# Altium footprint library 2016AbbasBasereh9365731239.PcbLib: 204 footprints (part 8 of 13)
Each footprint in its own frame and in the unit in brackets; x right, y up, seen from the top. Pads: shape width x height; smd on the part's side, far side on the other; paste and mask are expansions set on the pad; w line width, h text height; cw(c..) or ccw(c..) is an arc to the next point about the centre after c.
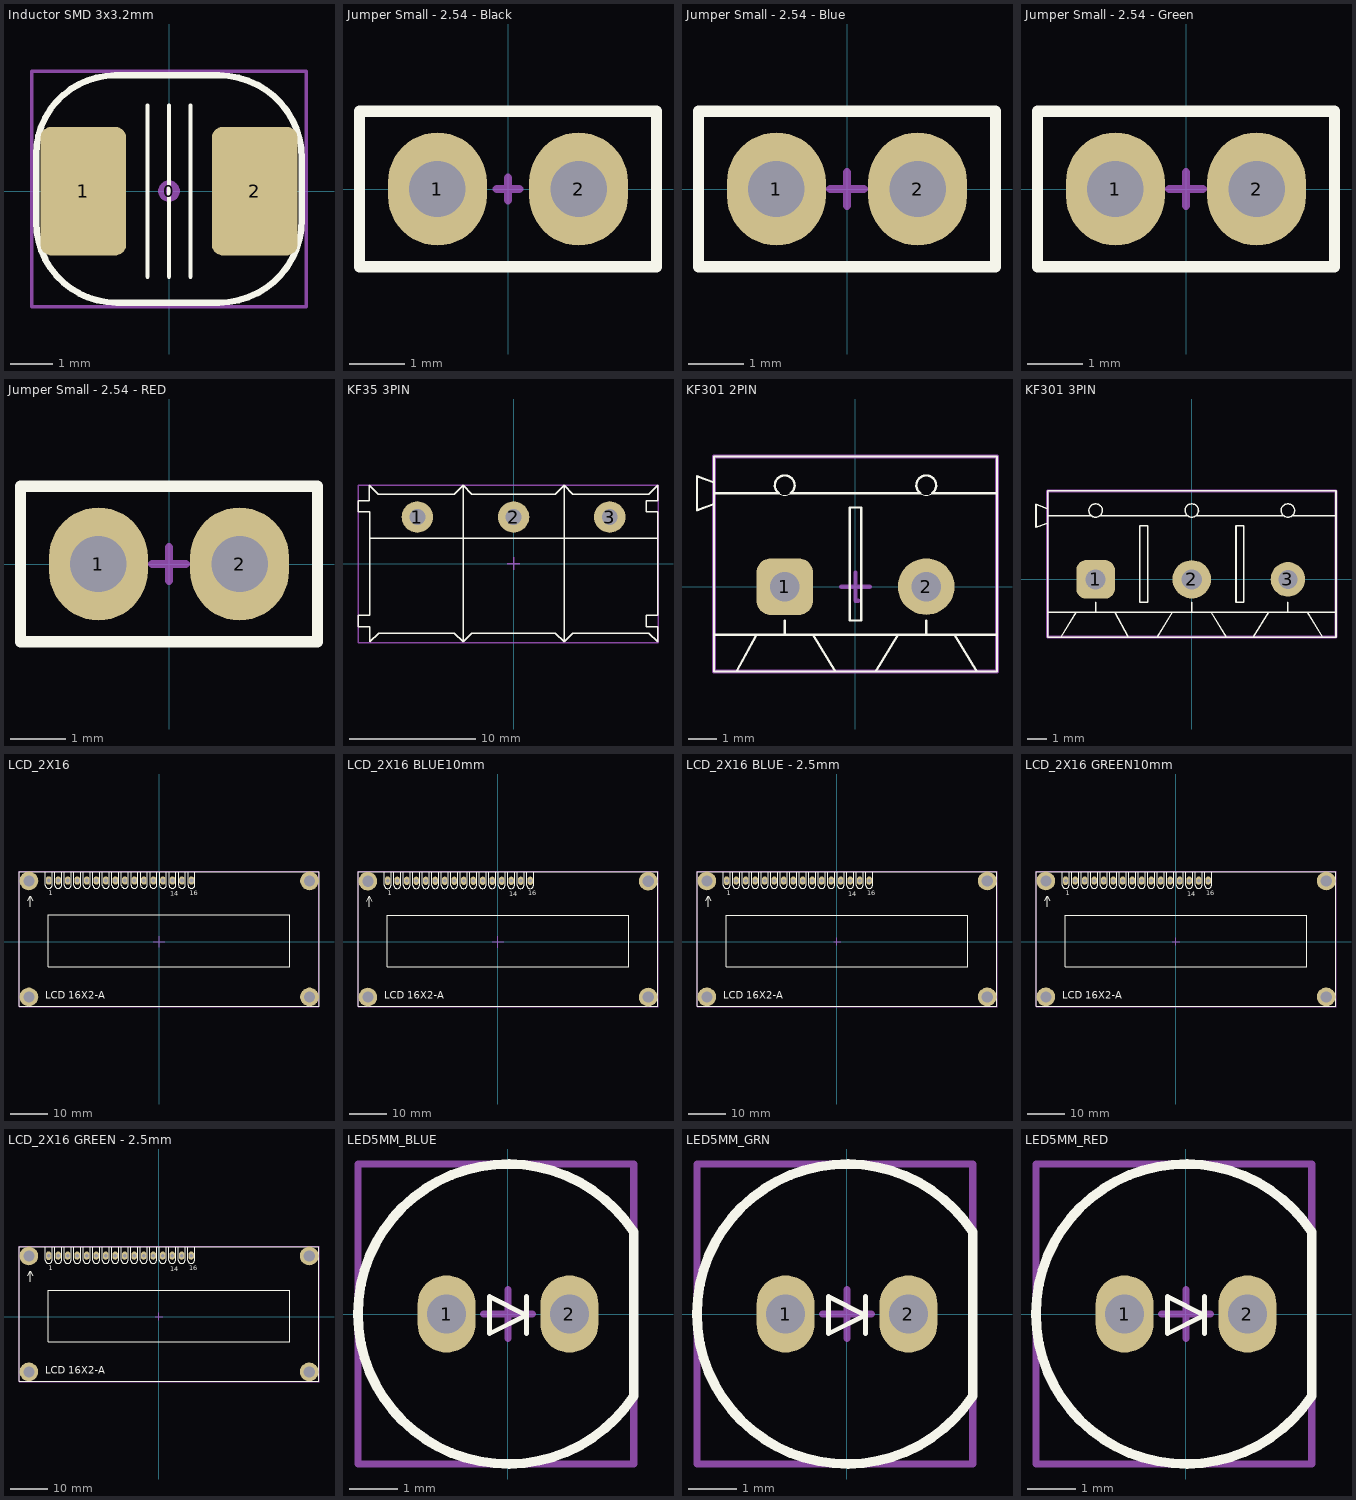
[diagram p7: the footprints below, top view; thin cyan lines are the x and y axes]

## Inductor SMD 3x3.2mm [mm] "Inductor 4.7µH SMD 3x3.2mm"
pads (3):
  round 0.508 on Mech15: 0(0,0)
  rrect25% 2x3 smd: 1(-2,0) 2(2,0)
Top Overlay:
  lines w0.1: -0.5,-2 -0.5,2 ; 0,-2 0,2 ; 0.5,-2 0.5,2
  lines w0.15: -3.1,-0.725 ccw(c-1.225,-0.725) -1.225,-2.6 1.165,-2.6 ccw(c1.165,-0.665) 3.1,-0.665 3.1,0.765 ccw(c1.165,0.765) 1.165,2.7 -1.252,2.7 ccw(c-1.252,0.852) -3.1,0.852 -3.1,-0.725
Mechanical 15:
  lines w0.076: -3.2,-2.7 3.2,-2.7 3.2,2.8 -3.2,2.8 -3.2,-2.7
3D body "smd self 4.7uH.stp": height 4.5, standoff 0, extent -2.899,-2.6 2.889,2.6

## Jumper Small - 2.54 - Black [mil] "Designer Abbas Basereh"
height 300
pads (2):
  oval 70x80 hole 40: 1(-50,0) 2(50,0)
Top Overlay:
  lines w7.87: -105.12,-55.12 105.12,-55.12 105.12,55.12 -105.12,55.12 -105.12,-55.12
Mechanical 15:
  lines w5.91: -7.87,0 7.87,0 ; 0,-7.87 0,7.87 ; -106.3,-55.12 106.3,-55.12 106.3,55.12 -106.3,55.12 -106.3,-55.12
3D body "jumper_akspt_g-red.STEP": height 337.4, standoff 102.36, extent -98.03,-48.03 98.04,48.04
3D body "header02.STEP": height 330, standoff -100, extent -100,-50 100,50

## Jumper Small - 2.54 - Blue [mil] "Designer Abbas Basereh"
height 300
pads (2):
  oval 70x80 hole 40: 1(-50,0) 2(50,0)
Top Overlay:
  lines w7.87: -105.12,-55.12 105.12,-55.12 105.12,55.12 -105.12,55.12 -105.12,-55.12
Mechanical 15:
  lines w5.91: -11.81,0 11.81,0 ; 0,-11.81 0,11.81 ; -106.3,-55.12 -106.3,55.12 106.3,55.12 106.3,-55.12 -106.3,-55.12
3D body "jumper_akspt_g-red.STEP": height 337.4, standoff 102.36, extent -98.03,-48.03 98.04,48.04
3D body "header02.STEP": height 330, standoff -100, extent -100,-50 100,50

## Jumper Small - 2.54 - Green [mil] "Designer Abbas Basereh"
height 300
pads (2):
  oval 70x80 hole 40: 1(-50,0) 2(50,0)
Top Overlay:
  lines w7.87: -105.12,-55.12 -105.12,55.12 105.12,55.12 105.12,-55.12 -105.12,-55.12
Mechanical 15:
  lines w5.91: -11.81,0 11.81,0 ; 0,-11.81 0,11.81 ; -106.3,-55.12 106.3,-55.12 106.3,55.12 -106.3,55.12 -106.3,-55.12
3D body "header02.STEP": height 330, standoff -100, extent -100,-50 100,50
3D body "jumper_akspt_g-red.STEP": height 337.4, standoff 102.36, extent -98.03,-48.03 98.04,48.04

## Jumper Small - 2.54 - RED [mil] "Designer Abbas Basereh"
height 300
pads (2):
  oval 70x80 hole 40: 1(-50,0) 2(50,0)
Top Overlay:
  lines w7.87: -105.12,-55.12 -105.12,55.12 105.12,55.12 105.12,-55.12 -105.12,-55.12
Mechanical 15:
  lines w5.91: -11.81,0 11.81,0 ; 0,-11.81 0,11.81 ; -106.3,-55.12 -106.3,55.12 106.3,55.12 106.3,-55.12 -106.3,-55.12
3D body "header02.STEP": height 330, standoff -100, extent -100,-50 100,50
3D body "jumper_akspt_g-red.STEP": height 337.4, standoff 102.36, extent -98.03,-48.03 98.04,48.04

## KF35 3PIN [mm] "Designer Abbas Basereh"
height 12.5
pads (3):
  round 2.5 hole 1.25: 1(-7.62,3.7) 2(0,3.7) 3(7.62,3.7)
Top Overlay:
  lines w0.1: -11.4,2 11.4,2 ; -4,-6.2 -4,6.2 ; -4,-6.2 -3.3,-5.5 3.3,-5.5 4,-6.2 ; -4,-6.2 -4.7,-5.5 -10.7,-5.5 -11.4,-6.2 -11.4,-5 -12.3,-5 -12.3,-4.1 -11.4,-4.1 -11.4,4.1 -11.43,4.1 -12.33,4.1 -12.33,5 -11.43,5 -11.43,6.2 -10.73,5.5 -4.7,5.5 -4,6.2 ; -4,6.2 -3.3,5.5 3.3,5.5 4,6.2 ; 4,-6.2 4,6.2 ; 4,-6.2 4.7,-5.5 10.73,-5.5 11.43,-6.2 11.43,-5 10.53,-5 10.53,-4.1 11.43,-4.1 11.43,4.1 10.53,4.1 10.53,5 11.43,5 11.43,6.2 10.73,5.5 4.7,5.5 4,6.2
Mechanical 15:
  lines w0.1: -0.5,0 0.5,0 ; 0,-0.5 0,0.5 ; -12.3,-6.275 -12.3,6.225 11.45,6.225 11.45,-6.275 -12.3,-6.275

## KF301 2PIN [mm] "Designer Abbas Basereh"
height 7.5
pads (2):
  rrect50% 2x2 hole 1.05: 1(-2.5,0)
  round 2 hole 1.05: 2(2.5,0)
Top Overlay:
  lines w0.013: -2.71,3.3 ccw(c-2.5,3.58) -2.29,3.3 ; 2.29,3.3 ccw(c2.5,3.58) 2.71,3.3
  lines w0.08: -4.2,-3 -3.5,-1.7 -1.5,-1.7 -0.7,-3 ; -2.5,-1.7 -2.5,-1.2 ; 0.7,-3 1.5,-1.7 3.5,-1.7 4.3,-3 ; 2.5,-1.7 2.5,-1.2 ; -5.6,2.7 -5,2.918 ; -5.6,2.7 -5.6,3.9 ; -5.6,2.7 -5,2.918 ; -5.6,2.7 -5.6,3.9 ; -5.6,3.9 -5,3.682 ; -5.6,3.9 -5,3.682 ; -5,-3 -5,-1.7 ; -5,-3 5,-3 ; -5,-3 5,-3 ; -5,-3 -5,2.918 ; -5,-1.7 -5,3.3 ; -5,-1.7 5,-1.7 ; -5,3.3 -5,4.6 ; -5,3.3 -2.71,3.3 cw(c-2.5,3.58) -2.29,3.3 2.29,3.3 cw(c2.5,3.58) 2.71,3.3 5,3.3 ; -5,3.682 -5,4.6 ; -5,4.6 5,4.6 ; -5,4.6 5,4.6 ; 5,-3 5,-1.7 ; 5,-3 5,4.6 ; 5,-1.7 5,3.3 ; 5,3.3 5,4.6 ; -0.2,-1.2 -0.2,2.8 0.2,2.8 0.2,-1.2 -0.2,-1.2
Mechanical 15:
  lines w0.15: -0.5,0 0.5,0 ; 0,0.5 0,-0.5 0.1,-0.5 ; -5,-3 5,-3 5,4.6 -5,4.6 -5,-3
3D body "User Library-Terminal-Screw-3A-2way.STEP": height 10, standoff -3, extent -5.6,-3 5,4.6

## KF301 3PIN [mm] "Designer Abbas Basereh"
height 7.5
pads (3):
  rrect50% 2x2 hole 1.05: 1(-5,0)
  round 2 hole 1.05: 2(0,0)
  round 1.8 hole 1: 3(5,0)
Top Overlay:
  lines w0.08: -6.8,-3 -6,-1.7 -4,-1.7 -3.3,-3 ; -5,-1.7 -5,-1.2 ; -1.8,-3 -1,-1.7 1,-1.7 1.8,-3 ; 0,-1.7 0,-1.2 ; 3.2,-3 4,-1.7 6,-1.7 6.8,-3 ; 5,-1.7 5,-1.2 ; -8.1,2.7 -7.5,2.918 ; -8.1,2.7 -8.1,3.9 ; -8.1,2.7 -8.1,3.9 ; -8.1,2.7 -7.5,2.918 ; -8.1,3.9 -7.5,3.681 ; -8.1,3.9 -7.5,3.681 ; -7.5,-3 7.5,-3 ; -7.5,-3 -7.5,2.918 ; -7.5,-3 7.5,-3 ; -7.5,-3 -7.5,-1.7 ; -7.5,-1.7 7.5,-1.7 ; -7.5,-1.7 -7.5,3.3 ; -7.5,3.3 -5.21,3.3 ; -7.5,3.3 -7.5,4.6 ; -7.5,3.681 -7.5,4.6 ; -7.5,4.6 7.5,4.6 ; -7.5,4.6 7.5,4.6 ; -5.21,3.3 cw(c-5,3.58) -4.79,3.3 ; -5.21,3.3 ccw(c-5,3.58) -4.79,3.3 ; -4.79,3.3 -0.21,3.3 ; -0.21,3.3 cw(c0,3.58) 0.21,3.3 ; -0.21,3.3 ccw(c0,3.58) 0.21,3.3 ; 0.21,3.3 4.79,3.3 ; 4.79,3.3 cw(c5,3.58) 5.21,3.3 ; 4.79,3.3 ccw(c5,3.58) 5.21,3.3 ; 5.21,3.3 7.5,3.3 ; 7.5,-3 7.5,4.6 ; 7.5,-3 7.5,-1.7 ; 7.5,-1.7 7.5,3.3 ; 7.5,3.3 7.5,4.6 ; -2.7,-1.2 -2.7,2.8 -2.3,2.8 -2.3,-1.2 -2.7,-1.2 ; 2.3,-1.2 2.7,-1.2 2.7,2.8 2.3,2.8 2.3,-1.2
Mechanical 15:
  lines w0.15: -7.5,-3 -7.5,4.6 7.5,4.6 7.5,-3 -7.5,-3
3D body "User Library-Terminal-Screw-3A-3way.STEP": height 10, standoff -3, extent -8.1,-3 7.5,4.6

## LCD_2X16 [mm] "LCD 2x16 Alphanumberic-Designer Abbas Basereh"
height 50
pads (20):
  oct 1.5x2.2 hole 1: 1(-29.464,16.3)
  oval 1.5x2.2 hole 1: 2(-26.924,16.3) 3(-24.384,16.3) 4(-21.844,16.3) 5(-19.304,16.3) 6(-16.764,16.3) 7(-14.224,16.3) 8(-11.684,16.3) 9(-9.144,16.3) 10(-6.604,16.3) 11(-4.064,16.3) 12(-1.524,16.3) 13(1.016,16.3) 14(3.556,16.3) 15(6.096,16.3) 16(8.636,16.3)
  round 5 hole 3: ""(-34.756,-14.775) ""(-34.756,16.213) ""(40.174,-14.775) ""(40.174,16.213)
Top Overlay:
  circle w0.2: c-34.796,-14.788 r1.25
  circle w0.2: c40.204,-14.788 r1.25
  circle w0.2: c-34.796,16.213 r1.25
  circle w0.2: c40.204,16.213 r1.25
  lines w0.2: -35.01,10.879 -34.375,12.149 -33.74,10.879 ; -34.375,9.337 -34.375,12.022 ; -30.353,18.669 -30.353,15.113 ccw(c-29.464,15.113) -28.575,15.113 -28.575,18.669 ; -27.813,18.669 -27.813,15.113 ccw(c-26.924,15.113) -26.035,15.113 -26.035,18.669 ; -25.273,18.669 -25.273,15.113 ccw(c-24.384,15.113) -23.495,15.113 -23.495,18.669 ; -22.733,18.669 -22.733,15.113 ccw(c-21.844,15.113) -20.955,15.113 -20.955,18.669 ; -20.193,18.669 -20.193,15.113 ccw(c-19.304,15.113) -18.415,15.113 -18.415,18.669 ; -17.653,18.669 -17.653,15.113 ccw(c-16.764,15.113) -15.875,15.113 -15.875,18.669 ; -15.113,18.669 -15.113,15.113 ccw(c-14.224,15.113) -13.335,15.113 -13.335,18.669 ; -12.573,18.669 -12.573,15.113 ccw(c-11.684,15.113) -10.795,15.113 -10.795,18.669 ; -10.033,18.669 -10.033,15.113 ccw(c-9.144,15.113) -8.255,15.113 -8.255,18.669 ; -7.493,18.669 -7.493,15.113 ccw(c-6.604,15.113) -5.715,15.113 -5.715,18.669 ; -4.953,18.669 -4.953,15.113 ccw(c-4.064,15.113) -3.175,15.113 -3.175,18.669 ; -2.413,18.669 -2.413,15.113 ccw(c-1.524,15.113) -0.635,15.113 -0.635,18.669 ; 0.127,18.669 0.127,15.113 ccw(c1.016,15.113) 1.905,15.113 1.905,18.669 ; 2.667,18.669 2.667,15.113 ccw(c3.556,15.113) 4.445,15.113 4.445,18.669 ; 5.207,18.669 5.207,15.113 ccw(c6.096,15.113) 6.985,15.113 6.985,18.669 ; 7.747,18.669 7.747,15.113 ccw(c8.636,15.113) 9.525,15.113 9.525,18.669 ; -37.296,-17.288 42.704,-17.288 42.704,18.712 -37.296,18.712 -37.296,-17.288 ; -29.546,-6.688 -29.546,7.112 34.954,7.112 34.954,-6.688 -29.546,-6.688
  text "14" at 3.048,12.192 h1.27
  text "1" at -29.464,12.446 h1.27
  text "16" at 8.128,12.446 h1.27
  text "LCD 16X2-A" at -30.438,-15.283 h1.91
Mechanical 15:
  lines w0.15: -1.5,0 1.5,0 ; 0,-1.5 0,1.5 ; -37.4,-17.4 42.7,-17.4 42.7,18.8 -37.4,18.8 -37.4,-17.4
3D body "User Library-AC162B.STEP": height 21, standoff 7.1, extent -37.35,-17.3 42.65,18.7
3D body: height 10, standoff 0, extent -37.338,13.589 -32.131,18.796
3D body: height 10, standoff 0, extent -37.338,-17.399 -32.131,-12.192
3D body: height 10, standoff 0, extent 37.592,-17.399 42.799,-12.192
3D body: height 10, standoff 0, extent 37.592,13.589 42.799,18.796

## LCD_2X16 BLUE10mm [mm] "LCD 2x16 Alphanumberic-Designer Abbas Basereh"
height 50
pads (20):
  oct 1.5x2.2 hole 1: 1(-29.464,16.3)
  oval 1.5x2.2 hole 1: 2(-26.924,16.3) 3(-24.384,16.3) 4(-21.844,16.3) 5(-19.304,16.3) 6(-16.764,16.3) 7(-14.224,16.3) 8(-11.684,16.3) 9(-9.144,16.3) 10(-6.604,16.3) 11(-4.064,16.3) 12(-1.524,16.3) 13(1.016,16.3) 14(3.556,16.3) 15(6.096,16.3) 16(8.636,16.3)
  round 5 hole 3: ""(-34.756,-14.775) ""(-34.756,16.213) ""(40.174,-14.775) ""(40.174,16.213)
Top Overlay:
  circle w0.2: c40.204,16.213 r1.25
  circle w0.2: c-34.796,16.213 r1.25
  circle w0.2: c40.204,-14.788 r1.25
  circle w0.2: c-34.796,-14.788 r1.25
  lines w0.2: -35.01,10.879 -34.375,12.149 -33.74,10.879 ; -34.375,9.337 -34.375,12.022 ; -30.353,18.669 -30.353,15.113 ccw(c-29.464,15.113) -28.575,15.113 -28.575,18.669 ; -27.813,18.669 -27.813,15.113 ccw(c-26.924,15.113) -26.035,15.113 -26.035,18.669 ; -25.273,18.669 -25.273,15.113 ccw(c-24.384,15.113) -23.495,15.113 -23.495,18.669 ; -22.733,18.669 -22.733,15.113 ccw(c-21.844,15.113) -20.955,15.113 -20.955,18.669 ; -20.193,18.669 -20.193,15.113 ccw(c-19.304,15.113) -18.415,15.113 -18.415,18.669 ; -17.653,18.669 -17.653,15.113 ccw(c-16.764,15.113) -15.875,15.113 -15.875,18.669 ; -15.113,18.669 -15.113,15.113 ccw(c-14.224,15.113) -13.335,15.113 -13.335,18.669 ; -12.573,18.669 -12.573,15.113 ccw(c-11.684,15.113) -10.795,15.113 -10.795,18.669 ; -10.033,18.669 -10.033,15.113 ccw(c-9.144,15.113) -8.255,15.113 -8.255,18.669 ; -7.493,18.669 -7.493,15.113 ccw(c-6.604,15.113) -5.715,15.113 -5.715,18.669 ; -4.953,18.669 -4.953,15.113 ccw(c-4.064,15.113) -3.175,15.113 -3.175,18.669 ; -2.413,18.669 -2.413,15.113 ccw(c-1.524,15.113) -0.635,15.113 -0.635,18.669 ; 0.127,18.669 0.127,15.113 ccw(c1.016,15.113) 1.905,15.113 1.905,18.669 ; 2.667,18.669 2.667,15.113 ccw(c3.556,15.113) 4.445,15.113 4.445,18.669 ; 5.207,18.669 5.207,15.113 ccw(c6.096,15.113) 6.985,15.113 6.985,18.669 ; 7.747,18.669 7.747,15.113 ccw(c8.636,15.113) 9.525,15.113 9.525,18.669 ; -37.296,-17.288 -37.296,18.712 42.704,18.712 42.704,-17.288 -37.296,-17.288 ; -29.546,-6.688 34.954,-6.688 34.954,7.112 -29.546,7.112 -29.546,-6.688
  text "LCD 16X2-A" at -30.438,-15.283 h1.91
  text "16" at 8.128,12.446 h1.27
  text "1" at -29.464,12.446 h1.27
  text "14" at 3.048,12.192 h1.27
Mechanical 15:
  lines w0.15: -1.5,0 1.5,0 ; -0.1,-1.6 -0.1,1.5 ; -37.4,-17.4 42.8,-17.4 42.8,18.9 -37.4,18.9 -37.4,-17.4
3D body: height 10, standoff 0, extent 37.592,13.589 42.799,18.796
3D body: height 10, standoff 0, extent 37.592,-17.399 42.799,-12.192
3D body: height 10, standoff 0, extent -37.338,-17.399 -32.131,-12.192
3D body: height 10, standoff 0, extent -37.338,13.589 -32.131,18.796
3D body "User Library-LCD-5.STEP": height 19.8, standoff 1.5, extent -37.35,-17.3 42.65,18.7
3D body: height 10, standoff 0, extent -30.25,15.25 9.75,17.75

## LCD_2X16 BLUE - 2.5mm [mm] "LCD 2x16 Alphanumberic-Designer Abbas Basereh"
height 40
pads (20):
  oct 1.5x2.2 hole 1: 1(-29.464,16.3)
  oval 1.5x2.2 hole 1: 2(-26.924,16.3) 3(-24.384,16.3) 4(-21.844,16.3) 5(-19.304,16.3) 6(-16.764,16.3) 7(-14.224,16.3) 8(-11.684,16.3) 9(-9.144,16.3) 10(-6.604,16.3) 11(-4.064,16.3) 12(-1.524,16.3) 13(1.016,16.3) 14(3.556,16.3) 15(6.096,16.3) 16(8.636,16.3)
  round 5 hole 3: ""(-34.756,-14.775) ""(-34.756,16.213) ""(40.174,-14.775) ""(40.174,16.213)
Top Overlay:
  circle w0.2: c40.204,16.213 r1.25
  circle w0.2: c-34.796,16.213 r1.25
  circle w0.2: c40.204,-14.788 r1.25
  circle w0.2: c-34.796,-14.788 r1.25
  lines w0.2: -35.01,10.879 -34.375,12.149 -33.74,10.879 ; -34.375,9.337 -34.375,12.022 ; -30.353,18.669 -30.353,15.113 ccw(c-29.464,15.113) -28.575,15.113 -28.575,18.669 ; -27.813,18.669 -27.813,15.113 ccw(c-26.924,15.113) -26.035,15.113 -26.035,18.669 ; -25.273,18.669 -25.273,15.113 ccw(c-24.384,15.113) -23.495,15.113 -23.495,18.669 ; -22.733,18.669 -22.733,15.113 ccw(c-21.844,15.113) -20.955,15.113 -20.955,18.669 ; -20.193,18.669 -20.193,15.113 ccw(c-19.304,15.113) -18.415,15.113 -18.415,18.669 ; -17.653,18.669 -17.653,15.113 ccw(c-16.764,15.113) -15.875,15.113 -15.875,18.669 ; -15.113,18.669 -15.113,15.113 ccw(c-14.224,15.113) -13.335,15.113 -13.335,18.669 ; -12.573,18.669 -12.573,15.113 ccw(c-11.684,15.113) -10.795,15.113 -10.795,18.669 ; -10.033,18.669 -10.033,15.113 ccw(c-9.144,15.113) -8.255,15.113 -8.255,18.669 ; -7.493,18.669 -7.493,15.113 ccw(c-6.604,15.113) -5.715,15.113 -5.715,18.669 ; -4.953,18.669 -4.953,15.113 ccw(c-4.064,15.113) -3.175,15.113 -3.175,18.669 ; -2.413,18.669 -2.413,15.113 ccw(c-1.524,15.113) -0.635,15.113 -0.635,18.669 ; 0.127,18.669 0.127,15.113 ccw(c1.016,15.113) 1.905,15.113 1.905,18.669 ; 2.667,18.669 2.667,15.113 ccw(c3.556,15.113) 4.445,15.113 4.445,18.669 ; 5.207,18.669 5.207,15.113 ccw(c6.096,15.113) 6.985,15.113 6.985,18.669 ; 7.747,18.669 7.747,15.113 ccw(c8.636,15.113) 9.525,15.113 9.525,18.669 ; -37.296,-17.288 -37.296,18.712 42.704,18.712 42.704,-17.288 -37.296,-17.288 ; -29.546,-6.688 34.954,-6.688 34.954,7.112 -29.546,7.112 -29.546,-6.688
  text "LCD 16X2-A" at -30.438,-15.283 h1.91
  text "16" at 8.128,12.446 h1.27
  text "1" at -29.464,12.446 h1.27
  text "14" at 3.048,12.192 h1.27
Mechanical 15:
  lines w0.15: -0.9,0 1,0 ; 0,-1 0,1 ; -37.4,-17.4 -37.4,18.8 42.8,18.8 42.8,-17.4 -37.4,-17.4
3D body "User Library-LCD-5.STEP": height 12.3, standoff -6, extent -37.35,-17.3 42.65,18.7

## LCD_2X16 GREEN10mm [mm] "LCD 2x16 Alphanumberic-Designer Abbas Basereh"
height 50
pads (20):
  oct 1.5x2.2 hole 1: 1(-29.464,16.3)
  oval 1.5x2.2 hole 1: 2(-26.924,16.3) 3(-24.384,16.3) 4(-21.844,16.3) 5(-19.304,16.3) 6(-16.764,16.3) 7(-14.224,16.3) 8(-11.684,16.3) 9(-9.144,16.3) 10(-6.604,16.3) 11(-4.064,16.3) 12(-1.524,16.3) 13(1.016,16.3) 14(3.556,16.3) 15(6.096,16.3) 16(8.636,16.3)
  round 5 hole 3: ""(-34.756,-14.775) ""(-34.756,16.213) ""(40.174,-14.775) ""(40.174,16.213)
Top Overlay:
  circle w0.2: c-34.796,-14.788 r1.25
  circle w0.2: c40.204,-14.788 r1.25
  circle w0.2: c-34.796,16.213 r1.25
  circle w0.2: c40.204,16.213 r1.25
  lines w0.2: -35.01,10.879 -34.375,12.149 -33.74,10.879 ; -34.375,9.337 -34.375,12.022 ; -30.353,18.669 -30.353,15.113 ccw(c-29.464,15.113) -28.575,15.113 -28.575,18.669 ; -27.813,18.669 -27.813,15.113 ccw(c-26.924,15.113) -26.035,15.113 -26.035,18.669 ; -25.273,18.669 -25.273,15.113 ccw(c-24.384,15.113) -23.495,15.113 -23.495,18.669 ; -22.733,18.669 -22.733,15.113 ccw(c-21.844,15.113) -20.955,15.113 -20.955,18.669 ; -20.193,18.669 -20.193,15.113 ccw(c-19.304,15.113) -18.415,15.113 -18.415,18.669 ; -17.653,18.669 -17.653,15.113 ccw(c-16.764,15.113) -15.875,15.113 -15.875,18.669 ; -15.113,18.669 -15.113,15.113 ccw(c-14.224,15.113) -13.335,15.113 -13.335,18.669 ; -12.573,18.669 -12.573,15.113 ccw(c-11.684,15.113) -10.795,15.113 -10.795,18.669 ; -10.033,18.669 -10.033,15.113 ccw(c-9.144,15.113) -8.255,15.113 -8.255,18.669 ; -7.493,18.669 -7.493,15.113 ccw(c-6.604,15.113) -5.715,15.113 -5.715,18.669 ; -4.953,18.669 -4.953,15.113 ccw(c-4.064,15.113) -3.175,15.113 -3.175,18.669 ; -2.413,18.669 -2.413,15.113 ccw(c-1.524,15.113) -0.635,15.113 -0.635,18.669 ; 0.127,18.669 0.127,15.113 ccw(c1.016,15.113) 1.905,15.113 1.905,18.669 ; 2.667,18.669 2.667,15.113 ccw(c3.556,15.113) 4.445,15.113 4.445,18.669 ; 5.207,18.669 5.207,15.113 ccw(c6.096,15.113) 6.985,15.113 6.985,18.669 ; 7.747,18.669 7.747,15.113 ccw(c8.636,15.113) 9.525,15.113 9.525,18.669 ; -37.296,-17.288 42.704,-17.288 42.704,18.712 -37.296,18.712 -37.296,-17.288 ; -29.546,-6.688 -29.546,7.112 34.954,7.112 34.954,-6.688 -29.546,-6.688
  text "14" at 3.048,12.192 h1.27
  text "1" at -29.464,12.446 h1.27
  text "16" at 8.128,12.446 h1.27
  text "LCD 16X2-A" at -30.438,-15.283 h1.91
Mechanical 15:
  lines w0.15: -1,0 1,0 ; 0,-1 0,1 ; -37.4,-17.4 -37.4,18.8 42.8,18.8 42.8,-17.4 -37.3,-17.4 -37.4,-17.4
3D body: height 10, standoff 0, extent -30.25,15.25 9.75,17.75
3D body "User Library-LCD 16x2 JHD162A.STEP": height 20.6, standoff 7.45, extent -37.35,-17.3 42.65,18.7
3D body: height 10, standoff 0, extent -37.338,13.589 -32.131,18.796
3D body: height 10, standoff 0, extent -37.338,-17.399 -32.131,-12.192
3D body: height 10, standoff 0, extent 37.592,-17.399 42.799,-12.192
3D body: height 10, standoff 0, extent 37.592,13.589 42.799,18.796

## LCD_2X16 GREEN - 2.5mm [mm] "LCD 2x16 Alphanumberic-Designer Abbas Basereh"
height 40
pads (20):
  oct 1.5x2.2 hole 1: 1(-29.464,16.3)
  oval 1.5x2.2 hole 1: 2(-26.924,16.3) 3(-24.384,16.3) 4(-21.844,16.3) 5(-19.304,16.3) 6(-16.764,16.3) 7(-14.224,16.3) 8(-11.684,16.3) 9(-9.144,16.3) 10(-6.604,16.3) 11(-4.064,16.3) 12(-1.524,16.3) 13(1.016,16.3) 14(3.556,16.3) 15(6.096,16.3) 16(8.636,16.3)
  round 5 hole 3: ""(-34.756,-14.775) ""(-34.756,16.213) ""(40.174,-14.775) ""(40.174,16.213)
Top Overlay:
  circle w0.2: c-34.796,-14.788 r1.25
  circle w0.2: c40.204,-14.788 r1.25
  circle w0.2: c-34.796,16.213 r1.25
  circle w0.2: c40.204,16.213 r1.25
  lines w0.2: -35.01,10.879 -34.375,12.149 -33.74,10.879 ; -34.375,9.337 -34.375,12.022 ; -30.353,18.669 -30.353,15.113 ccw(c-29.464,15.113) -28.575,15.113 -28.575,18.669 ; -27.813,18.669 -27.813,15.113 ccw(c-26.924,15.113) -26.035,15.113 -26.035,18.669 ; -25.273,18.669 -25.273,15.113 ccw(c-24.384,15.113) -23.495,15.113 -23.495,18.669 ; -22.733,18.669 -22.733,15.113 ccw(c-21.844,15.113) -20.955,15.113 -20.955,18.669 ; -20.193,18.669 -20.193,15.113 ccw(c-19.304,15.113) -18.415,15.113 -18.415,18.669 ; -17.653,18.669 -17.653,15.113 ccw(c-16.764,15.113) -15.875,15.113 -15.875,18.669 ; -15.113,18.669 -15.113,15.113 ccw(c-14.224,15.113) -13.335,15.113 -13.335,18.669 ; -12.573,18.669 -12.573,15.113 ccw(c-11.684,15.113) -10.795,15.113 -10.795,18.669 ; -10.033,18.669 -10.033,15.113 ccw(c-9.144,15.113) -8.255,15.113 -8.255,18.669 ; -7.493,18.669 -7.493,15.113 ccw(c-6.604,15.113) -5.715,15.113 -5.715,18.669 ; -4.953,18.669 -4.953,15.113 ccw(c-4.064,15.113) -3.175,15.113 -3.175,18.669 ; -2.413,18.669 -2.413,15.113 ccw(c-1.524,15.113) -0.635,15.113 -0.635,18.669 ; 0.127,18.669 0.127,15.113 ccw(c1.016,15.113) 1.905,15.113 1.905,18.669 ; 2.667,18.669 2.667,15.113 ccw(c3.556,15.113) 4.445,15.113 4.445,18.669 ; 5.207,18.669 5.207,15.113 ccw(c6.096,15.113) 6.985,15.113 6.985,18.669 ; 7.747,18.669 7.747,15.113 ccw(c8.636,15.113) 9.525,15.113 9.525,18.669 ; -37.296,-17.288 42.704,-17.288 42.704,18.712 -37.296,18.712 -37.296,-17.288 ; -29.546,-6.688 -29.546,7.112 34.954,7.112 34.954,-6.688 -29.546,-6.688
  text "14" at 3.048,12.192 h1.27
  text "1" at -29.464,12.446 h1.27
  text "16" at 8.128,12.446 h1.27
  text "LCD 16X2-A" at -30.438,-15.283 h1.91
Mechanical 15:
  lines w0.15: -1,0 1,0 ; 0,-1 0,1 ; -37.4,-17.4 -37.4,18.8 42.8,18.8 42.8,-17.4 -37.4,-17.4
3D body "User Library-LCD 16x2 JHD162A.STEP": height 13.1, standoff -0.05, extent -37.35,-17.3 42.65,18.7

## LED5MM_BLUE [mm] "LED 5MM THROUGH HOLE BLUE-Designer Abbas Basereh"
height 7.62
pads (2):
  oval 1.2x1.6 hole 0.8: 1(-1.27,0) 2(1.27,0)
Top Overlay:
  lines w0.1: 0.381,-0.403 0.381,0.359 ; -0.381,-0.403 0.381,-0.022 -0.381,0.359 -0.381,-0.403
  lines w0.2: 2.6,-1.7 2.6,1.7 ; 2.6,-1.688 cw(c0,0) 2.6,1.688
Mechanical 15:
  lines w0.15: -0.5,0 0.5,0 ; 0,-0.5 0,0.5 ; -3.1,-3.1 2.6,-3.1 2.6,3.1 -3.1,3.1 -3.1,-3.1
3D body "LED-D5G.step": height 9.14, standoff -6.3, extent -3,-3 2.5,3

## LED5MM_GRN [mm] "LED 5MM THROUGH HOLE GREEN-Designer Abbas Basereh"
height 7.62
pads (2):
  oval 1.2x1.6 hole 0.8: 1(-1.27,0) 2(1.27,0)
Top Overlay:
  lines w0.1: 0.381,-0.403 0.381,0.359 ; -0.381,-0.403 0.381,-0.022 -0.381,0.359 -0.381,-0.403
  lines w0.2: 2.6,-1.7 2.6,1.7 ; 2.6,-1.688 cw(c0,0) 2.6,1.688
Mechanical 15:
  lines w0.15: -0.5,0 0.5,0 ; 0,-0.5 0,0.5 ; -3.1,-3.1 2.6,-3.1 2.6,3.1 -3.1,3.1 -3.1,-3.1
3D body "LED-D5G.step": height 9.14, standoff -6.3, extent -3,-3 2.5,3

## LED5MM_RED [mm] "LED 5MM THROUGH HOLE RED-Designer Abbas Basereh"
height 7.62
pads (2):
  oval 1.2x1.6 hole 0.8: 1(-1.27,0) 2(1.27,0)
Top Overlay:
  lines w0.1: 0.381,-0.403 0.381,0.359 ; -0.381,-0.403 0.381,-0.022 -0.381,0.359 -0.381,-0.403
  lines w0.2: 2.6,-1.7 2.6,1.7 ; 2.6,-1.688 cw(c0,0) 2.6,1.688
Mechanical 15:
  lines w0.15: -0.5,0 0.5,0 ; 0,-0.5 0,0.5 ; -3.1,-3.1 2.6,-3.1 2.6,3.1 -3.1,3.1 -3.1,-3.1
3D body "LED-D5G.step": height 9.14, standoff -6.3, extent -3,-3 2.5,3